# Altium footprint library ST封装.PcbLib: 1336 footprints (part 37 of 109)
Each footprint in its own frame and in the unit in brackets; x right, y up, seen from the top. Pads: shape width x height; smd on the part's side, far side on the other; paste and mask are expansions set on the pad; w line width, h text height; cw(c..) or ccw(c..) is an arc to the next point about the centre after c.
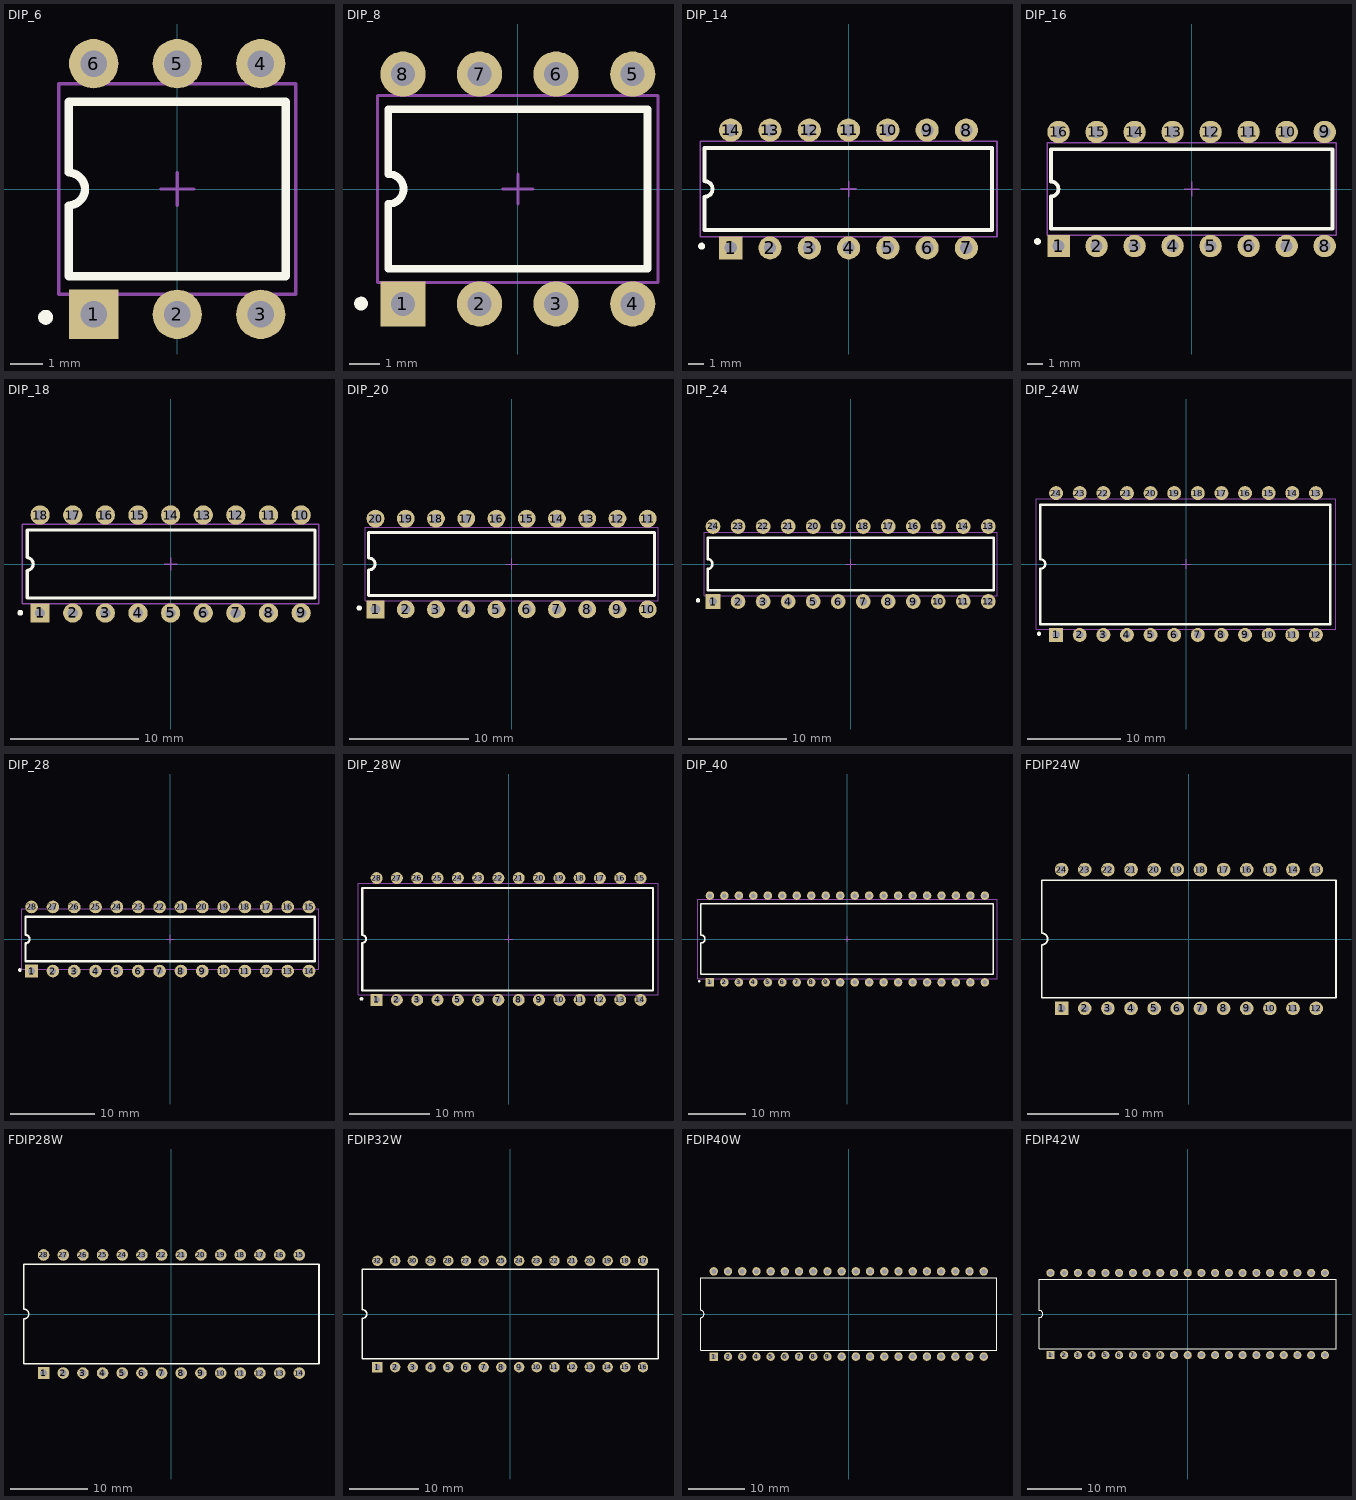
[diagram p36: the footprints below, top view; thin cyan lines are the x and y axes]

## DIP_6 [mm] "7.62"
pads (6):
  rect 1.5x1.5 hole 0.8: 1(-2.54,-3.81)
  round 1.5 hole 0.8: 2(0,-3.81) 3(2.54,-3.81) 4(2.54,3.81) 5(0,3.81) 6(-2.54,3.81)
Top Overlay:
  circle w0.254: c-4,-3.9 r0.1
  lines w0.254: -3.3,-2.65 -3.3,-0.5 ccw(c-3.304,0) -3.3,0.5 -3.3,2.65 3.3,2.65 3.3,-2.65 -3.3,-2.65
Mechanical 15:
  lines w0.1: -0.5,0 0.5,0 ; 0,-0.5 0,0.5 ; -3.6,-3.2 3.6,-3.2 3.6,3.2 -3.6,3.2 -3.6,-3.2
3D body "DIP6-1.STEP": height 4.5, standoff -2.8, extent -3.56,-4 3.56,3.87

## DIP_8 [mm] "7.62"
pads (8):
  rect 1.5x1.5 hole 0.8: 1(-3.81,-3.81)
  round 1.5 hole 0.8: 2(-1.27,-3.81) 3(1.27,-3.81) 4(3.81,-3.81) 5(3.81,3.81) 6(1.27,3.81) 7(-1.27,3.81) 8(-3.81,3.81)
Top Overlay:
  circle w0.254: c-5.2,-3.8 r0.1
  lines w0.254: -4.3,-2.65 4.3,-2.65 4.3,2.65 -4.3,2.65 -4.3,0.5 cw(c-4.29,0) -4.3,-0.5 -4.3,-2.65
Mechanical 15:
  lines w0.1: -0.5,0 0.5,0 ; 0,-0.5 0,0.5 ; -4.65,-3.1 -4.65,3.1 4.65,3.1 4.65,-3.1 -4.65,-3.1
3D body "DIP8-1.STEP": height 4.57, standoff -3.81, extent -4.955,-3.9 4.955,3.92

## DIP_14 [mm] "7.62"
pads (14):
  rect 1.5x1.5 hole 0.8: 1(-7.62,-3.81)
  round 1.5 hole 0.8: 2(-5.08,-3.81) 3(-2.54,-3.81) 4(0,-3.81) 5(2.54,-3.81) 6(5.08,-3.81) 7(7.62,-3.81) 8(7.62,3.81) 9(5.08,3.81) 10(2.54,3.81) 11(0,3.81) 12(-2.54,3.81) 13(-5.08,3.81) 14(-7.62,3.81)
Top Overlay:
  circle w0.254: c-9.5,-3.7 r0.1
  lines w0.254: -9.32,-2.65 9.28,-2.65 9.28,2.65 -9.32,2.65 -9.32,0.5 cw(c-9.3,0) -9.32,-0.5 -9.32,-2.65
Mechanical 15:
  lines w0.1: -9.6,-3.1 9.6,-3.1 9.6,3.1 -9.6,3.1 ; -9.591,-3.1 -9.591,3.1 ; -0.5,0 0.5,0 ; 0,-0.5 0,0.5
3D body "DIP14.STEP": height 4.57, standoff -3.81, extent -9.691,-3.91 9.739,3.91

## DIP_16 [mm] "7.62"
pads (16):
  rect 1.5x1.5 hole 0.8: 1(-8.89,-3.81)
  round 1.5 hole 0.8: 2(-6.35,-3.81) 3(-3.81,-3.81) 4(-1.27,-3.81) 5(1.27,-3.81) 6(3.81,-3.81) 7(6.35,-3.81) 8(8.89,-3.81) 9(8.89,3.81) 10(6.35,3.81) 11(3.81,3.81) 12(1.27,3.81) 13(-1.27,3.81) 14(-3.81,3.81) 15(-6.35,3.81) 16(-8.89,3.81)
Top Overlay:
  circle w0.254: c-10.3,-3.5 r0.1
  lines w0.254: -9.39,-2.65 -9.39,-0.5 ccw(c-9.4,0) -9.39,0.5 -9.39,2.65 9.41,2.65 9.41,-2.65 -9.39,-2.65
Mechanical 15:
  lines w0.1: -0.5,0 0.5,0 ; 0,-0.5 0,0.5 ; -9.65,-3.1 -9.65,3.1 9.65,3.1 9.65,-3.1 -9.65,-3.1
3D body "DIP16.STEP": height 4.57, standoff -3.81, extent -9.685,-3.9 9.745,3.92

## DIP_18 [mm] "7.62"
pads (18):
  rect 1.5x1.5 hole 0.8: 1(-10.16,-3.81)
  round 1.5 hole 0.8: 2(-7.62,-3.81) 3(-5.08,-3.81) 4(-2.54,-3.81) 5(0,-3.81) 6(2.54,-3.81) 7(5.08,-3.81) 8(7.62,-3.81) 9(10.16,-3.81) 10(10.16,3.81) 11(7.62,3.81) 12(5.08,3.81) 13(2.54,3.81) 14(0,3.81) 15(-2.54,3.81) 16(-5.08,3.81) 17(-7.62,3.81) 18(-10.16,3.81)
Top Overlay:
  circle w0.254: c-11.7,-3.8 r0.1
  lines w0.254: -11.16,-2.65 11.23,-2.65 11.23,2.65 -11.16,2.65 -11.16,0.5 cw(c-11.2,0) -11.16,-0.5 -11.16,-2.65
Mechanical 15:
  lines w0.1: -0.5,0 0.5,0 ; 0,-0.5 0,0.5 ; -11.55,-3.1 -11.55,3.1 11.55,3.1 11.55,-3.1 -11.55,-3.1
3D body "DIP18.STEP": height 4.57, standoff -3.81, extent -11.61,-3.9 11.63,3.92

## DIP_20 [mm] "7.62"
pads (20):
  rect 1.5x1.5 hole 0.8: 1(-11.43,-3.81)
  round 1.5 hole 0.8: 2(-8.89,-3.81) 3(-6.35,-3.81) 4(-3.81,-3.81) 5(-1.27,-3.81) 6(1.27,-3.81) 7(3.81,-3.81) 8(6.35,-3.81) 9(8.89,-3.81) 10(11.43,-3.81) 11(11.43,3.81) 12(8.89,3.81) 13(6.35,3.81) 14(3.81,3.81) 15(1.27,3.81) 16(-1.27,3.81) 17(-3.81,3.81) 18(-6.35,3.81) 19(-8.89,3.81) 20(-11.43,3.81)
Top Overlay:
  circle w0.254: c-12.8,-3.7 r0.1
  lines w0.254: -12,-2.65 -12,-0.5 ccw(c-11.97,0) -12,0.5 -12,2.65 12,2.65 12,-2.65 -12,-2.65
Mechanical 15:
  lines w0.1: -0.5,0 0.5,0 ; 0,-0.5 0,0.5 ; -12.3,-3.1 -12.3,3.1 12.3,3.1 12.3,-3.1 -12.3,-3.1
3D body "DIP-20pin.STEP": height 4.65, standoff -1.57, extent -12.89,-3.9 12.89,3.974

## DIP_24 [mm] "7.62"
pads (24):
  rect 1.5x1.5 hole 0.8: 1(-13.97,-3.81)
  round 1.5 hole 0.8: 2(-11.43,-3.81) 3(-8.89,-3.81) 4(-6.35,-3.81) 5(-3.81,-3.81) 6(-1.27,-3.81) 7(1.27,-3.81) 8(3.81,-3.81) 9(6.35,-3.81) 10(8.89,-3.81) 11(11.43,-3.81) 12(13.97,-3.81) 13(13.97,3.81) 14(11.43,3.81) 15(8.89,3.81) 16(6.35,3.81) 17(3.81,3.81) 18(1.27,3.81) 19(-1.27,3.81) 20(-3.81,3.81) 21(-6.35,3.81) 22(-8.89,3.81) 23(-11.43,3.81) 24(-13.97,3.81)
Top Overlay:
  circle w0.254: c-15.5,-3.7 r0.1
  lines w0.254: -14.5,-2.65 14.5,-2.65 14.5,2.65 -14.5,2.65 -14.5,0.5 cw(c-14.53,0) -14.5,-0.5 -14.5,-2.65
Mechanical 15:
  lines w0.1: -0.5,0 0.5,0 ; 0,-0.5 0,0.5 ; -14.85,-3.2 -14.85,3.2 14.85,3.2 14.85,-3.2 -14.85,-3.2
3D body "DIP24.STEP": height 4.57, standoff -3.81, extent -16.03,-3.9 16.1,3.92

## DIP_24W [mm] "15.24"
pads (24):
  rect 1.5x1.5 hole 0.8: 1(-13.97,-7.62)
  round 1.5 hole 0.8: 2(-11.43,-7.62) 3(-8.89,-7.62) 4(-6.35,-7.62) 5(-3.81,-7.62) 6(-1.27,-7.62) 7(1.27,-7.62) 8(3.81,-7.62) 9(6.35,-7.62) 10(8.89,-7.62) 11(11.43,-7.62) 12(13.97,-7.62) 13(13.97,7.62) 14(11.43,7.62) 15(8.89,7.62) 16(6.35,7.62) 17(3.81,7.62) 18(1.27,7.62) 19(-1.27,7.62) 20(-3.81,7.62) 21(-6.35,7.62) 22(-8.89,7.62) 23(-11.43,7.62) 24(-13.97,7.62)
Top Overlay:
  circle w0.254: c-15.8,-7.5 r0.1
  lines w0.254: -15.67,-0.5 -15.67,-6.46 15.53,-6.46 15.53,6.38 -15.67,6.38 -15.67,0.5 ; -15.6,-0.5 ccw(c-15.63,0) -15.6,0.5
Mechanical 15:
  lines w0.1: -0.5,0 0.5,0 ; 0,-0.5 0,0.5 ; -16.13,-7 -16.13,7 16.13,7 16.13,-7 -16.13,-7
3D body "DIP24-W.STEP": height 5.09, standoff -3.81, extent -16.13,-7.71 16.13,7.73

## DIP_28 [mm] "7.62"
pads (28):
  rect 1.5x1.5 hole 0.8: 1(-16.51,-3.81)
  round 1.5 hole 0.8: 2(-13.97,-3.81) 3(-11.43,-3.81) 4(-8.89,-3.81) 5(-6.35,-3.81) 6(-3.81,-3.81) 7(-1.27,-3.81) 8(1.27,-3.81) 9(3.81,-3.81) 10(6.35,-3.81) 11(8.89,-3.81) 12(11.43,-3.81) 13(13.97,-3.81) 14(16.51,-3.81) 15(16.51,3.81) 16(13.97,3.81) 17(11.43,3.81) 18(8.89,3.81) 19(6.35,3.81) 20(3.81,3.81) 21(1.27,3.81) 22(-1.27,3.81) 23(-3.81,3.81) 24(-6.35,3.81) 25(-8.89,3.81) 26(-11.43,3.81) 27(-13.97,3.81) 28(-16.51,3.81)
Top Overlay:
  circle w0.254: c-17.9,-3.7 r0.1
  lines w0.254: -17.21,-2.65 17.19,-2.65 17.19,2.65 -17.21,2.65 -17.21,0.49 cw(c-17.24,-0.01) -17.21,-0.51 -17.21,-2.65
Mechanical 15:
  lines w0.1: -0.5,0 0.5,0 ; 0,-0.5 0,0.5 ; -17.7,-3.6 17.7,-3.6 17.7,3.6 -17.7,3.6 -17.7,-3.6
3D body "DIP28.STEP": height 4.57, standoff -3.81, extent -17.56,-3.92 17.49,3.9

## DIP_28W [mm] "15.24"
pads (28):
  rect 1.5x1.5 hole 0.8: 1(-16.51,-7.62)
  round 1.5 hole 0.8: 2(-13.97,-7.62) 3(-11.43,-7.62) 4(-8.89,-7.62) 5(-6.35,-7.62) 6(-3.81,-7.62) 7(-1.27,-7.62) 8(1.27,-7.62) 9(3.81,-7.62) 10(6.35,-7.62) 11(8.89,-7.62) 12(11.43,-7.62) 13(13.97,-7.62) 14(16.51,-7.62) 15(16.51,7.62) 16(13.97,7.62) 17(11.43,7.62) 18(8.89,7.62) 19(6.35,7.62) 20(3.81,7.62) 21(1.27,7.62) 22(-1.27,7.62) 23(-3.81,7.62) 24(-6.35,7.62) 25(-8.89,7.62) 26(-11.43,7.62) 27(-13.97,7.62) 28(-16.51,7.62)
Top Overlay:
  circle w0.254: c-18.4,-7.5 r0.1
  lines w0.254: -18.31,-6.46 -18.31,-0.5 ccw(c-18.34,0) -18.31,0.5 -18.31,6.38 18.09,6.38 18.09,-6.46 -18.31,-6.46
Mechanical 15:
  lines w0.1: -0.5,0 0.5,0 ; 0,-0.5 0,0.5 ; -18.8,-7 18.7,-7 18.7,7 -18.8,7 -18.8,-7
3D body "DIP28-W.STEP": height 5.09, standoff -3.81, extent -18.71,-7.76 18.63,7.68

## DIP_40 [mm] "15.24"
pads (40):
  rect 1.5x1.5 hole 0.8: 1(-24.13,-7.62)
  round 1.5 hole 0.8: 2(-21.59,-7.62) 3(-19.05,-7.62) 4(-16.51,-7.62) 5(-13.97,-7.62) 6(-11.43,-7.62) 7(-8.89,-7.62) 8(-6.35,-7.62) 9(-3.81,-7.62) 10(-1.27,-7.62) 11(1.27,-7.62) 12(3.81,-7.62) 13(6.35,-7.62) 14(8.89,-7.62) 15(11.43,-7.62) 16(13.97,-7.62) 17(16.51,-7.62) 18(19.05,-7.62) 19(21.59,-7.62) 20(24.13,-7.62) 21(24.13,7.62) 22(21.59,7.62) 23(19.05,7.62) 24(16.51,7.62) 25(13.97,7.62) 26(11.43,7.62) 27(8.89,7.62) 28(6.35,7.62) 29(3.81,7.62) 30(1.27,7.62) 31(-1.27,7.62) 32(-3.81,7.62) 33(-6.35,7.62) 34(-8.89,7.62) 35(-11.43,7.62) 36(-13.97,7.62) 37(-16.51,7.62) 38(-19.05,7.62) 39(-21.59,7.62) 40(-24.13,7.62)
Top Overlay:
  circle w0.254: c-26,-7.4 r0.1
  lines w0.254: -25.7,-6.2 25.6,-6.2 25.6,6.2 -25.7,6.2 -25.7,0.7 cw(c-25.7,0) -25.7,-0.7 -25.7,-6.2
Mechanical 15:
  lines w0.1: -0.5,0 0.5,0 ; 0,-0.5 0,0.5 ; -26.25,-7 -26.25,7 26.25,7 26.25,-7 -26.25,-7
3D body "DIP40.STEP": height 5.7, standoff -2.58, extent -26.225,-7.8 26.225,7.69

## FDIP24W [mm] "Ceramic Frit-seal DIP, Window; 24 Leads; Row Spacing 15.24 mm; Pitch 2.54 mm"
height 5.71
pads (24):
  rect 1.5x1.5 hole 0.9: 1(-13.97,-7.62)
  round 1.5 hole 0.9: 2(-11.43,-7.62) 3(-8.89,-7.62) 4(-6.35,-7.62) 5(-3.81,-7.62) 6(-1.27,-7.62) 7(1.27,-7.62) 8(3.81,-7.62) 9(6.35,-7.62) 10(8.89,-7.62) 11(11.43,-7.62) 12(13.97,-7.62) 13(13.97,7.62) 14(11.43,7.62) 15(8.89,7.62) 16(6.35,7.62) 17(3.81,7.62) 18(1.27,7.62) 19(-1.27,7.62) 20(-3.81,7.62) 21(-6.35,7.62) 22(-8.89,7.62) 23(-11.43,7.62) 24(-13.97,7.62)
Top Overlay:
  lines w0.2: -16.15,-6.45 -16.15,-0.635 ccw(c-16.15,0) -16.15,0.635 -16.15,6.45 16.15,6.45 16.15,-6.45 -16.15,-6.45

## FDIP28W [mm] "Ceramic Frit-seal DIP, Window; 28 Leads; Row Spacing 15.24 mm; Pitch 2.54 mm"
height 5.71
pads (28):
  rect 1.5x1.5 hole 0.9: 1(-16.51,-7.62)
  round 1.5 hole 0.9: 2(-13.97,-7.62) 3(-11.43,-7.62) 4(-8.89,-7.62) 5(-6.35,-7.62) 6(-3.81,-7.62) 7(-1.27,-7.62) 8(1.27,-7.62) 9(3.81,-7.62) 10(6.35,-7.62) 11(8.89,-7.62) 12(11.43,-7.62) 13(13.97,-7.62) 14(16.51,-7.62) 15(16.51,7.62) 16(13.97,7.62) 17(11.43,7.62) 18(8.89,7.62) 19(6.35,7.62) 20(3.81,7.62) 21(1.27,7.62) 22(-1.27,7.62) 23(-3.81,7.62) 24(-6.35,7.62) 25(-8.89,7.62) 26(-11.43,7.62) 27(-13.97,7.62) 28(-16.51,7.62)
Top Overlay:
  lines w0.2: -19.05,-6.45 -19.05,-0.635 ccw(c-19.05,0) -19.05,0.635 -19.05,6.45 19.05,6.45 19.05,-6.45 -19.05,-6.45

## FDIP32W [mm] "Ceramic Frit-seal DIP, Window; 32 Leads; Row Spacing 15.24 mm; Pitch 2.54 mm"
height 5.72
pads (32):
  rect 1.5x1.5 hole 0.9: 1(-19.05,-7.62)
  round 1.5 hole 0.9: 2(-16.51,-7.62) 3(-13.97,-7.62) 4(-11.43,-7.62) 5(-8.89,-7.62) 6(-6.35,-7.62) 7(-3.81,-7.62) 8(-1.27,-7.62) 9(1.27,-7.62) 10(3.81,-7.62) 11(6.35,-7.62) 12(8.89,-7.62) 13(11.43,-7.62) 14(13.97,-7.62) 15(16.51,-7.62) 16(19.05,-7.62) 17(19.05,7.62) 18(16.51,7.62) 19(13.97,7.62) 20(11.43,7.62) 21(8.89,7.62) 22(6.35,7.62) 23(3.81,7.62) 24(1.27,7.62) 25(-1.27,7.62) 26(-3.81,7.62) 27(-6.35,7.62) 28(-8.89,7.62) 29(-11.43,7.62) 30(-13.97,7.62) 31(-16.51,7.62) 32(-19.05,7.62)
Top Overlay:
  lines w0.2: -21.2,-6.45 -21.2,-0.635 ccw(c-21.2,0) -21.2,0.635 -21.2,6.45 21.2,6.45 21.2,-6.45 -21.2,-6.45

## FDIP40W [mm] "Ceramic Frit-seal DIP, Window; 40 Leads; Row Spacing 15.24 mm; Pitch 2.54 mm"
height 5.72
pads (40):
  rect 1.5x1.5 hole 0.9: 1(-24.13,-7.62)
  round 1.5 hole 0.9: 2(-21.59,-7.62) 3(-19.05,-7.62) 4(-16.51,-7.62) 5(-13.97,-7.62) 6(-11.43,-7.62) 7(-8.89,-7.62) 8(-6.35,-7.62) 9(-3.81,-7.62) 10(-1.27,-7.62) 11(1.27,-7.62) 12(3.81,-7.62) 13(6.35,-7.62) 14(8.89,-7.62) 15(11.43,-7.62) 16(13.97,-7.62) 17(16.51,-7.62) 18(19.05,-7.62) 19(21.59,-7.62) 20(24.13,-7.62) 21(24.13,7.62) 22(21.59,7.62) 23(19.05,7.62) 24(16.51,7.62) 25(13.97,7.62) 26(11.43,7.62) 27(8.89,7.62) 28(6.35,7.62) 29(3.81,7.62) 30(1.27,7.62) 31(-1.27,7.62) 32(-3.81,7.62) 33(-6.35,7.62) 34(-8.89,7.62) 35(-11.43,7.62) 36(-13.97,7.62) 37(-16.51,7.62) 38(-19.05,7.62) 39(-21.59,7.62) 40(-24.13,7.62)
Top Overlay:
  lines w0.2: -26.5,-6.45 -26.5,-0.635 ccw(c-26.5,0) -26.5,0.635 -26.5,6.45 26.5,6.45 26.5,-6.45 -26.5,-6.45

## FDIP42W [mm] "Ceramic Frit-seal DIP, Window; 42 Leads; Row Spacing 15.24 mm; Pitch 2.54 mm"
height 5.72
pads (42):
  rect 1.5x1.5 hole 0.9: 1(-25.4,-7.62)
  round 1.5 hole 0.9: 2(-22.86,-7.62) 3(-20.32,-7.62) 4(-17.78,-7.62) 5(-15.24,-7.62) 6(-12.7,-7.62) 7(-10.16,-7.62) 8(-7.62,-7.62) 9(-5.08,-7.62) 10(-2.54,-7.62) 11(0,-7.62) 12(2.54,-7.62) 13(5.08,-7.62) 14(7.62,-7.62) 15(10.16,-7.62) 16(12.7,-7.62) 17(15.24,-7.62) 18(17.78,-7.62) 19(20.32,-7.62) 20(22.86,-7.62) 21(25.4,-7.62) 22(25.4,7.62) 23(22.86,7.62) 24(20.32,7.62) 25(17.78,7.62) 26(15.24,7.62) 27(12.7,7.62) 28(10.16,7.62) 29(7.62,7.62) 30(5.08,7.62) 31(2.54,7.62) 32(0,7.62) 33(-2.54,7.62) 34(-5.08,7.62) 35(-7.62,7.62) 36(-10.16,7.62) 37(-12.7,7.62) 38(-15.24,7.62) 39(-17.78,7.62) 40(-20.32,7.62) 41(-22.86,7.62) 42(-25.4,7.62)
Top Overlay:
  lines w0.2: -27.45,-6.45 27.45,-6.45 27.45,6.45 -27.45,6.45 -27.45,0.635 cw(c-27.45,0) -27.45,-0.635 -27.45,-6.45